# Altium footprint library connectors_headers.PcbLib: 60 footprints (part 4 of 4)
Each footprint in its own frame and in the unit in brackets; x right, y up, seen from the top. Pads: shape width x height; smd on the part's side, far side on the other; paste and mask are expansions set on the pad; w line width, h text height; cw(c..) or ccw(c..) is an arc to the next point about the centre after c.
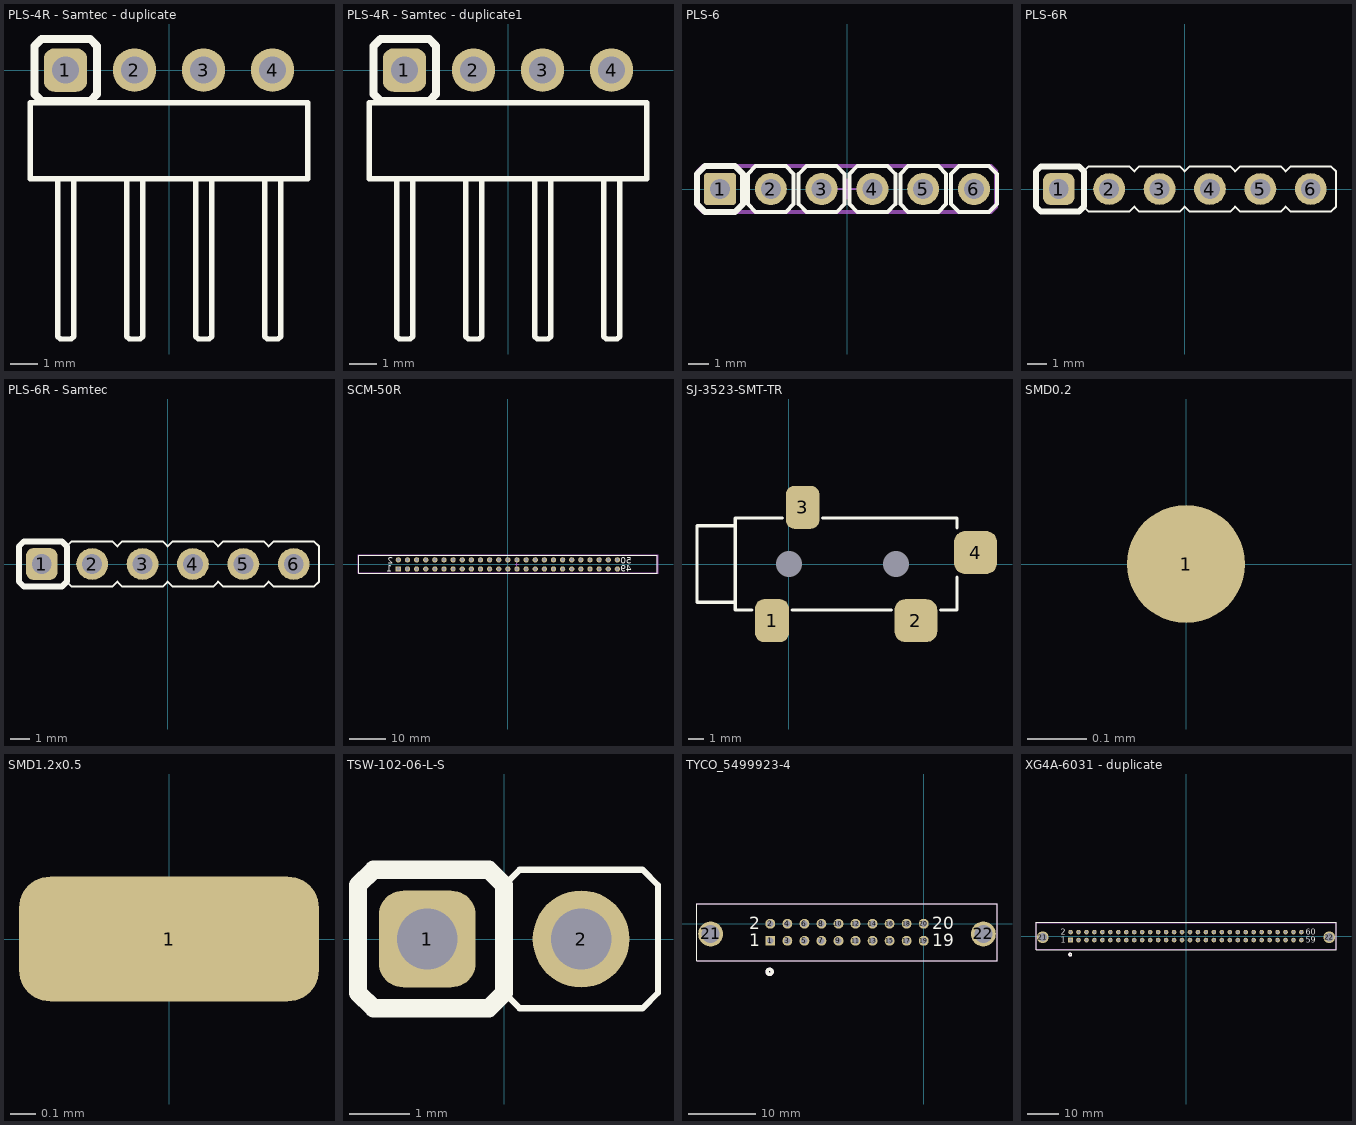
[diagram p3: the footprints below, top view; thin cyan lines are the x and y axes]

## PLS-4R - Samtec - duplicate [mm] "TSW-104-08-F-S-RA"
height 0.025
pads (4):
  rrect50% 1.6x1.6 hole 1: 1(-3.81,0)
  round 1.6 hole 1: 2(-1.27,0) 3(1.27,0) 4(3.81,0)
Top Overlay:
  lines w0.2: -4.1,-4 -4.1,-9.8 -4,-9.9 -3.6,-9.9 -3.5,-9.8 -3.5,-4 ; -1.56,-4 -1.56,-9.8 -1.46,-9.9 -1.06,-9.9 -0.96,-9.8 -0.96,-4 ; 0.98,-4 0.98,-9.8 1.08,-9.9 1.48,-9.9 1.58,-9.8 1.58,-4 ; 3.52,-4 3.52,-9.8 3.62,-9.9 4.02,-9.9 4.12,-9.8 4.12,-4 ; -5.1,-4 5.1,-4 5.1,-1.2 -5.1,-1.2 -5.1,-4
  lines w0.3: -4.953,-0.889 -4.953,0.889 -4.699,1.143 -2.9,1.143 -2.646,0.889 -2.646,-0.889 -2.9,-1.143 -4.699,-1.143 -4.953,-0.889
3D body "TSW-104-08-F-S-RA.stp": height 3.07, standoff -2.24, extent -5.08,-9.882 5.08,0.341

## PLS-4R - Samtec - duplicate1 [mm] "TSW-104-08-F-S-RA"
height 0.025
pads (4):
  rrect50% 1.6x1.6 hole 1: 1(-3.81,0)
  round 1.6 hole 1: 2(-1.27,0) 3(1.27,0) 4(3.81,0)
Top Overlay:
  lines w0.2: -4.1,-4 -4.1,-9.8 -4,-9.9 -3.6,-9.9 -3.5,-9.8 -3.5,-4 ; -1.56,-4 -1.56,-9.8 -1.46,-9.9 -1.06,-9.9 -0.96,-9.8 -0.96,-4 ; 0.98,-4 0.98,-9.8 1.08,-9.9 1.48,-9.9 1.58,-9.8 1.58,-4 ; 3.52,-4 3.52,-9.8 3.62,-9.9 4.02,-9.9 4.12,-9.8 4.12,-4 ; -5.1,-4 -5.1,-1.2 5.1,-1.2 5.1,-4 -5.1,-4
  lines w0.3: -4.953,-0.889 -4.699,-1.143 -2.9,-1.143 -2.646,-0.889 -2.646,0.889 -2.9,1.143 -4.699,1.143 -4.953,0.889 -4.953,-0.889
3D body "TSW-104-08-F-S-RA.stp": height 3.07, standoff -2.24, extent -5.08,-9.882 5.08,0.341

## PLS-6 [mm]
height 0.025
pads (6):
  rrect20% 1.6x1.6 hole 1: 1(-6.35,0)
  round 1.6 hole 1: 2(-3.81,0) 3(-1.27,0) 4(1.27,0) 5(3.81,0) 6(6.35,0)
Top Overlay:
  lines w0.2: -4.953,-0.757 -4.953,0.757 -4.567,1.143 -3.053,1.143 -2.667,0.757 -2.667,-0.757 -3.053,-1.143 -4.567,-1.143 -4.953,-0.757 ; -2.413,-0.757 -2.413,0.757 -2.027,1.143 -0.513,1.143 -0.127,0.757 -0.127,-0.757 -0.513,-1.143 -2.027,-1.143 -2.413,-0.757 ; 0.127,-0.757 0.127,0.757 0.513,1.143 2.027,1.143 2.413,0.757 2.413,-0.757 2.027,-1.143 0.513,-1.143 0.127,-0.757 ; 2.667,-0.757 2.667,0.757 3.053,1.143 4.567,1.143 4.953,0.757 4.953,-0.757 4.567,-1.143 3.053,-1.143 2.667,-0.757 ; 5.207,-0.757 5.207,0.757 5.593,1.143 7.107,1.143 7.493,0.757 7.493,-0.757 7.107,-1.143 5.593,-1.143 5.207,-0.757
  lines w0.3: -7.493,-0.757 -7.107,-1.143 -5.593,-1.143 -5.207,-0.757 -5.207,0.757 -5.593,1.143 -7.107,1.143 -7.493,0.757 -7.493,-0.757
M3_comm_top:
  text ".comment" at -1,-0.2 h1
M5_asm_top:
  lines w0.1: -7.4,-0.8 -7.4,0.8 -7.1,1.1 7.1,1.1 7.4,0.8 7.4,-0.8 7.1,-1.1 -7.1,-1.1 -7.4,-0.8
  text ".Designator" at -1.2,1.5 h1
M7_courtyard_top:
  lines w0.1: -7.5,0.7 -7.5,0.9 ; -0.5,0 0.5,0 ; 0,-0.5 0,0.5 ; 7.5,-0.7 7.5,-0.9 ; -7.5,0.9 -7.2,1.2 7.2,1.2 7.5,0.9 7.5,-0.9 ; -7.5,0.9 -7.5,-0.9 -7.2,-1.2 7.2,-1.2 7.5,-0.9
3D body "PLS-6.stp": height 9.45, standoff -2.95, extent -7.52,-1.251 7.72,1.245

## PLS-6R [mm] "002205206 Molex"
height 0.025
pads (6):
  rrect50% 1.6x1.6 hole 1: 1(-6.35,0)
  round 1.6 hole 1: 2(-3.81,0) 3(-1.27,0) 4(1.27,0) 5(3.81,0) 6(6.35,0)
Top Overlay:
  lines w0.1: -5.08,-0.889 -4.826,-1.143 -2.794,-1.143 -2.54,-0.889 -2.286,-1.143 -0.254,-1.143 0,-0.889 0.254,-1.143 2.286,-1.143 2.54,-0.889 2.794,-1.143 4.826,-1.143 5.08,-0.889 5.334,-1.143 7.366,-1.143 7.62,-0.889 7.62,0.889 7.366,1.143 5.334,1.143 5.08,0.889 4.826,1.143 2.794,1.143 2.54,0.889 2.286,1.143 0.254,1.143 0,0.889 -0.254,1.143 -2.286,1.143 -2.54,0.889 -2.794,1.143 -4.826,1.143 -5.08,0.889
  lines w0.3: -7.493,-0.889 -7.239,-1.143 -5.334,-1.143 -5.08,-0.889 -5.08,0.889 -5.334,1.143 -7.239,1.143 -7.493,0.889 -7.493,-0.889
3D body "PLS-6R.step": height 6.6, standoff -2.95, extent -7.62,-7.332 7.62,1.288

## PLS-6R - Samtec [mm] "TSW-106-08-F-S-RA"
height 0.025
pads (6):
  rrect50% 1.6x1.6 hole 1: 1(-6.35,0)
  round 1.6 hole 1: 2(-3.81,0) 3(-1.27,0) 4(1.27,0) 5(3.81,0) 6(6.35,0)
Top Overlay:
  lines w0.1: -5.08,-0.889 -4.826,-1.143 -2.794,-1.143 -2.54,-0.889 -2.286,-1.143 -0.254,-1.143 0,-0.889 0.254,-1.143 2.286,-1.143 2.54,-0.889 2.794,-1.143 4.826,-1.143 5.08,-0.889 5.334,-1.143 7.366,-1.143 7.62,-0.889 7.62,0.889 7.366,1.143 5.334,1.143 5.08,0.889 4.826,1.143 2.794,1.143 2.54,0.889 2.286,1.143 0.254,1.143 0,0.889 -0.254,1.143 -2.286,1.143 -2.54,0.889 -2.794,1.143 -4.826,1.143 -5.08,0.889
  lines w0.3: -7.493,-0.889 -7.493,0.889 -7.239,1.143 -5.334,1.143 -5.08,0.889 -5.08,-0.889 -5.334,-1.143 -7.239,-1.143 -7.493,-0.889
3D body "TSW-106-08-F-S-RA.stp": height 3.07, standoff -2.24, extent -7.62,-9.882 7.62,0.341

## SCM-50R [mil]
pads (50):
  rrect20% 58x58 hole 38: 1(-1200.39,-49.21)
  round 58 hole 38: 2(-1200.39,50) 3(-1100.39,-49.21) 4(-1100.39,50) 5(-1000.39,-50) 6(-1000.39,50) 7(-900.39,-50) 8(-900.39,50) 9(-800.39,-50) 10(-800.39,50) 11(-700.39,-50) 12(-700.39,50) 13(-600.39,-50) 14(-600.39,50) 15(-500.39,-50) 16(-500.39,50) 17(-400.39,-50) 18(-400.39,50) 19(-300.39,-50) 20(-300.39,50) 21(-200.39,-50) 22(-200.39,50) 23(-100.39,-50) 24(-100.39,50) 25(-0.39,-50) 26(-0.39,50) 27(99.61,-50) 28(99.61,50) 29(199.61,-50) 30(199.61,50) 31(299.61,-50) 32(299.61,50) 33(399.61,-50) 34(399.61,50) 35(499.61,-50) 36(499.61,50) 37(599.61,-50) 38(599.61,50) 39(699.61,-50) 40(699.61,50) 41(799.61,-50) 42(799.61,50) 43(899.61,-50) 44(899.61,50) 45(999.61,-50) 46(999.61,50) 47(1099.61,-50) 48(1099.61,50) 49(1199.61,-50) 50(1199.61,50)
Top Overlay:
  lines w7.87: -1632.68,-98.43 -1632.68,98.43 1635.04,98.43 1635.04,-98.43 -1632.68,-98.43
  text "49" at 1359.45,-78.74 h73.82
  text "50" at 1359.45,9.84 h73.82
  text "1" at -1268.5,-78.74 h73.82
  text "2" at -1258.66,9.84 h73.82
M3_comm_top:
  text ".comment" at 89.76,0 h39.37
M5_asm_top:
  lines w3.94: -1632.68,-88.58 1635.04,-88.58 1635.04,98.43 -1632.68,98.43 -1632.68,-88.58
  text ".Designator" at 157.48,108.27 h39.37
  text "2" at -1258.66,9.84 h73.82
  text "1" at -1268.5,-78.74 h73.82
  text "50" at 1359.45,9.84 h73.82
  text "49" at 1359.45,-78.74 h73.82
M7_courtyard_top:
  lines w3.94: 79.92,0 119.29,0 ; 99.61,-19.69 99.61,19.68 ; -1642.52,-98.43 1644.88,-98.43 1644.88,108.27 -1642.52,108.27 -1642.52,-98.43
3D body "c-1-5499345-0-c-3d.stp": height 322.85, standoff -102.15, extent -1628.81,-86.39 1631.19,853.35

## SJ-3523-SMT-TR [mm] "CONN JACK STEREO 3.5MM SMD"
pads (6):
  round 0 hole 1.7: 0(0,0) 0(7,0)
  rrect50% 2.2x2.8 smd: 1(-1.1,-3.7) 3(0.9,3.7)
  rrect50% 2.8x2.8 smd: 2(8.3,-3.7) 4(12.2,0.75)
Top Overlay:
  lines w0.2: -3.5,-2.5 -6,-2.5 -6,2.5 -3.5,2.5 ; -2.4,-3 -3.5,-3 -3.5,3 -0.4,3 ; 0.2,-3 6.7,-3 ; 2.2,3 11,3 11,2.35 ; 9.9,-3 11,-3 11,-0.85
3D body "sj-3523-smt.stp": height 5.1, standoff -0.7, extent -6,-4.5 11,4.5

## SMD0.2 [mm]
height 0.025
pads (1):
  round 0.2 smd mask+0.127: 1(0,0)

## SMD1.2x0.5 [mm]
height 0.025
pads (1):
  rrect50% 1.2x0.5 smd mask+0.05: 1(0,0)

## TSW-102-06-L-S [mm] "TSW-102-06-L-S"
height 0.025
pads (2):
  rrect50% 1.6x1.6 hole 1: 1(-1.27,0)
  round 1.6 hole 1: 2(1.27,0)
Top Overlay:
  lines w0.1: 0,-0.889 0.254,-1.143 2.286,-1.143 2.54,-0.889 2.54,0.889 2.286,1.143 0.254,1.143 0,0.889
  lines w0.3: -2.413,-0.889 -2.159,-1.143 -0.254,-1.143 0,-0.889 0,0.889 -0.254,1.143 -2.159,1.143 -2.413,0.889 -2.413,-0.889
3D body "TSW-102-06-L-S.stp": height 5.26, standoff -2.36, extent -2.667,-1.27 2.54,1.27

## TYCO_5499923-4 [mil]
pads (22):
  rect 58x58 hole 38: 1(-900,-100)
  round 58 hole 38: 2(-900,0) 3(-800,-100) 4(-800,0) 5(-700,-100) 6(-700,0) 7(-600,-100) 8(-600,0) 9(-500,-100) 10(-500,0) 11(-400,-100) 12(-400,0) 13(-300,-100) 14(-300,0) 15(-200,-100) 16(-200,0) 17(-100,-100) 18(-100,0) 19(0,-100) 20(0,0)
  round 146 hole 106: 21(-1250,-60) 22(350,-60)
Top Overlay:
  lines w6: -1330,-218 -1330,118 430,118 430,-218 -1330,-218
  lines w20: -919,-282 cw(c-904,-282) -889,-282 cw(c-904,-282) -919,-282
  text "20" at 51.04,-32.86 h73.82
  text "19" at 51.12,-133.14 h73.82
  text "2" at -1024.06,-32.89 h73.82
  text "1" at -1023.55,-133.03 h73.82
M1_3D_TOP:
  lines w6: -1330,-218 -1330,118 430,118 430,-218 -1330,-218
  lines w20: -919,-282 cw(c-904,-282) -889,-282 cw(c-904,-282) -919,-282
  text "20" at 51.12,-32.9 h73.82
  text "19" at 51.08,-133.03 h73.82
  text "2" at -1024.48,-32.9 h73.82
  text "1" at -1023.84,-133.06 h73.82
3D body "c-5499923-04-b-3d.stp": height 1061.28, standoff -148.72, extent -1329.99,-207.49 430.01,128.51

## XG4A-6031 - duplicate [mil] "XG4A-6031"
pads (62):
  rect 58x58 hole 38: 1(-1450,-50)
  round 58 hole 38: 2(-1450,50) 3(-1350,-50) 4(-1350,50) 5(-1250,-50) 6(-1250,50) 7(-1150,-50) 8(-1150,50) 9(-1050,-50) 10(-1050,50) 11(-950,-50) 12(-950,50) 13(-850,-50) 14(-850,50) 15(-750,-50) 16(-750,50) 17(-650,-50) 18(-650,50) 19(-550,-50) 20(-550,50) 21(-450,-50) 22(-450,50) 23(-350,-50) 24(-350,50) 25(-250,-50) 26(-250,50) 27(-150,-50) 28(-150,50) 29(-50,-50) 30(-50,50) 31(50,-50) 32(50,50) 33(150,-50) 34(150,50) 35(250,-50) 36(250,50) 37(350,-50) 38(350,50) 39(450,-50) 40(450,50) 41(550,-50) 42(550,50) 43(650,-50) 44(650,50) 45(750,-50) 46(750,50) 47(850,-50) 48(850,50) 49(950,-50) 50(950,50) 51(1050,-50) 52(1050,50) 53(1150,-50) 54(1150,50) 55(1250,-50) 56(1250,50) 57(1350,-50) 58(1350,50) 59(1450,-50) 60(1450,50)
  round 146 hole 106: 21(-1799.21,-15.23) 22(1799.21,-15.23)
Top Overlay:
  lines w6: -1883.86,-173.23 -1883.86,173.23 1883.86,173.23 1883.86,-173.23 -1883.86,-173.23
  lines w20: -1469,-232 cw(c-1454,-232) -1439,-232 cw(c-1454,-232) -1469,-232
  text "60" at 1501.04,17.14 h73.82
  text "59" at 1501.12,-83.14 h73.82
  text "2" at -1574.06,17.11 h73.82
  text "1" at -1573.55,-83.03 h73.82
M1_3D_TOP:
  lines w6: -1883.86,-168 -1883.86,168 1883.86,168 1883.86,-168 -1883.86,-168
  lines w20: -1469,-232 cw(c-1454,-232) -1439,-232 cw(c-1454,-232) -1469,-232
  text "60" at 1501.12,17.1 h73.82
  text "59" at 1501.08,-83.03 h73.82
  text "2" at -1574.48,17.1 h73.82
  text "1" at -1573.84,-83.06 h73.82
3D body "XG4A_6031.step": height 1062.99, standoff -125.98, extent -1879.92,-167.32 1879.92,167.32
3D body: height 531.5, standoff -124.02, extent -1360.82,-60.83 -1339.17,-39.17
3D body: height 531.5, standoff -124.02, extent -1260.82,-60.83 -1239.17,-39.17
3D body: height 531.5, standoff -124.02, extent -1360.82,39.17 -1339.17,60.83
3D body: height 531.5, standoff -124.02, extent -1460.82,39.17 -1439.17,60.83
3D body: height 531.5, standoff -124.02, extent -1160.82,39.17 -1139.17,60.83
3D body: height 531.5, standoff -124.02, extent -1260.82,39.17 -1239.17,60.83
3D body: height 531.5, standoff -124.02, extent -1060.82,-60.83 -1039.17,-39.17
3D body: height 531.5, standoff -124.02, extent -1160.82,-60.83 -1139.17,-39.17
3D body: height 531.5, standoff -124.02, extent -960.82,39.17 -939.17,60.83
3D body: height 531.5, standoff -124.02, extent -1060.82,39.17 -1039.17,60.83
3D body: height 531.5, standoff -124.02, extent -860.82,-60.83 -839.17,-39.17
3D body: height 531.5, standoff -124.02, extent -960.82,-60.83 -939.17,-39.17
3D body: height 531.5, standoff -124.02, extent -660.82,39.17 -639.17,60.83
3D body: height 531.5, standoff -124.02, extent -760.82,39.17 -739.17,60.83
3D body: height 531.5, standoff -124.02, extent -660.82,-60.83 -639.17,-39.17
3D body: height 531.5, standoff -124.02, extent -760.82,-60.83 -739.17,-39.17
3D body: height 531.5, standoff -124.02, extent -860.82,39.17 -839.17,60.83
3D body: height 531.5, standoff -124.02, extent -60.82,39.17 -39.17,60.83
3D body: height 531.5, standoff -124.02, extent 39.18,-60.83 60.83,-39.17
3D body: height 531.5, standoff -124.02, extent 139.18,-60.83 160.83,-39.17
3D body: height 531.5, standoff -124.02, extent 39.18,39.17 60.83,60.83
3D body: height 531.5, standoff -124.02, extent 139.18,39.17 160.83,60.83
3D body: height 531.5, standoff -124.02, extent -160.82,-60.83 -139.17,-39.17
3D body: height 531.5, standoff -124.02, extent -60.82,-60.83 -39.17,-39.17
3D body: height 531.5, standoff -124.02, extent -260.82,39.17 -239.17,60.83
3D body: height 531.5, standoff -124.02, extent -160.82,39.17 -139.17,60.83
3D body: height 531.5, standoff -124.02, extent -360.82,-60.83 -339.17,-39.17
3D body: height 531.5, standoff -124.02, extent -260.82,-60.83 -239.17,-39.17
3D body: height 531.5, standoff -124.02, extent -460.82,39.17 -439.17,60.83
3D body: height 531.5, standoff -124.02, extent -360.82,39.17 -339.17,60.83
3D body: height 531.5, standoff -124.02, extent -560.82,39.17 -539.17,60.83
3D body: height 531.5, standoff -124.02, extent -460.82,-60.83 -439.17,-39.17
3D body: height 531.5, standoff -124.02, extent -560.82,-60.83 -539.17,-39.17
3D body: height 531.5, standoff -124.02, extent 739.18,39.17 760.83,60.83
3D body: height 531.5, standoff -124.02, extent 839.18,-60.83 860.83,-39.17
3D body: height 531.5, standoff -124.02, extent 939.18,-60.83 960.83,-39.17
3D body: height 531.5, standoff -124.02, extent 839.18,39.17 860.83,60.83
3D body: height 531.5, standoff -124.02, extent 939.18,39.17 960.83,60.83
3D body: height 531.5, standoff -124.02, extent 639.18,-60.83 660.83,-39.17
3D body: height 531.5, standoff -124.02, extent 739.18,-60.83 760.83,-39.17
3D body: height 531.5, standoff -124.02, extent 539.18,39.17 560.83,60.83
3D body: height 531.5, standoff -124.02, extent 639.18,39.17 660.83,60.83
3D body: height 531.5, standoff -124.02, extent 439.18,-60.83 460.83,-39.17
3D body: height 531.5, standoff -124.02, extent 539.18,-60.83 560.83,-39.17
3D body: height 531.5, standoff -124.02, extent 339.18,39.17 360.83,60.83
3D body: height 531.5, standoff -124.02, extent 439.18,39.17 460.83,60.83
3D body: height 531.5, standoff -124.02, extent 239.18,39.17 260.83,60.83
3D body: height 531.5, standoff -124.02, extent 339.18,-60.83 360.83,-39.17
3D body: height 531.5, standoff -124.02, extent 239.18,-60.83 260.83,-39.17
3D body: height 531.5, standoff -124.02, extent 1039.18,-60.83 1060.83,-39.17
3D body: height 531.5, standoff -124.02, extent 1139.18,39.17 1160.83,60.83
3D body: height 531.5, standoff -124.02, extent 1039.18,39.17 1060.83,60.83
3D body: height 531.5, standoff -124.02, extent 1239.18,-60.83 1260.83,-39.17
3D body: height 531.5, standoff -124.02, extent 1139.18,-60.83 1160.83,-39.17
3D body: height 531.5, standoff -124.02, extent 1439.18,39.17 1460.83,60.83
3D body: height 531.5, standoff -124.02, extent 1339.18,39.17 1360.83,60.83
3D body: height 531.5, standoff -124.02, extent 1439.18,-60.83 1460.83,-39.17
3D body: height 531.5, standoff -124.02, extent 1339.18,-60.83 1360.83,-39.17
3D body: height 531.5, standoff -124.02, extent 1239.18,39.17 1260.83,60.83